# Altium footprint library AD_Lib.PcbLib: 508 footprints (part 10 of 32)
Each footprint in its own frame and in the unit in brackets; x right, y up, seen from the top. Pads: shape width x height; smd on the part's side, far side on the other; paste and mask are expansions set on the pad; w line width, h text height; cw(c..) or ccw(c..) is an arc to the next point about the centre after c.
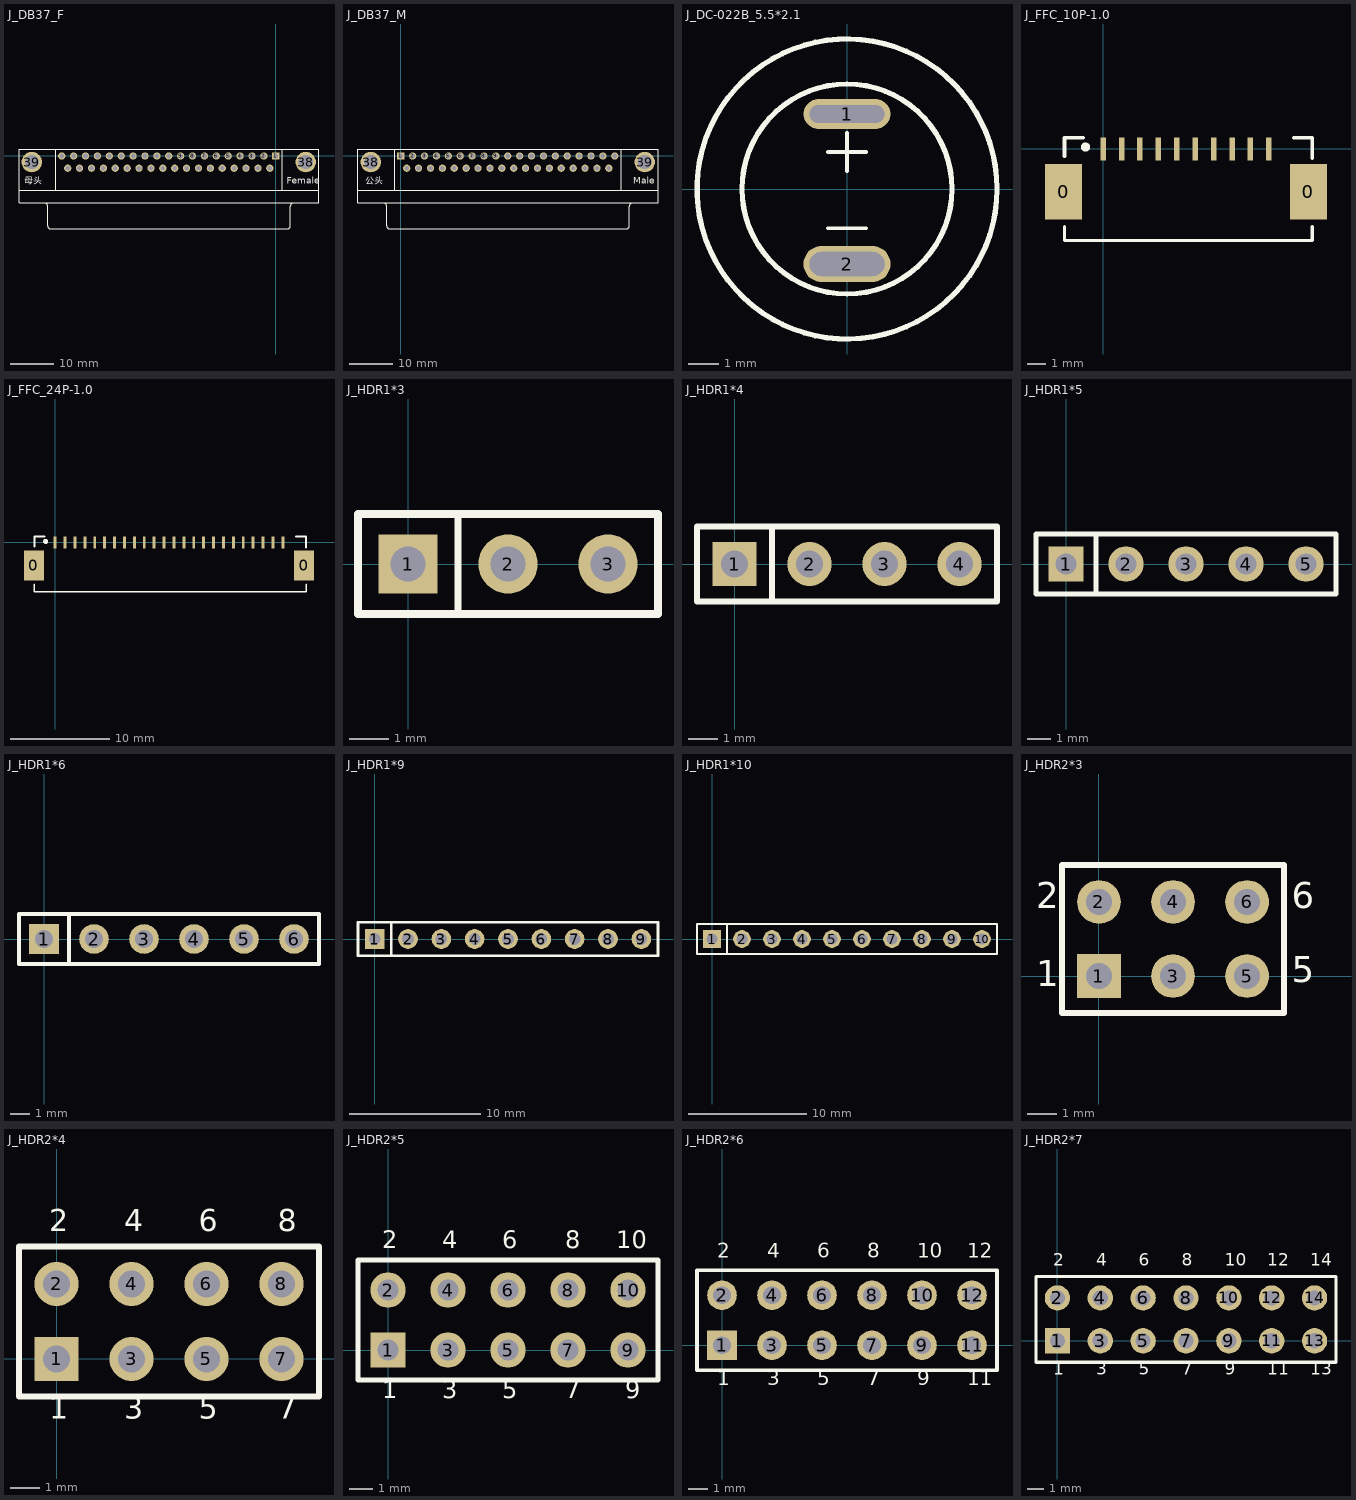
[diagram p9: the footprints below, top view; thin cyan lines are the x and y axes]

## J_DB37_F [mm] "DB37，母头，弯针"
pads (39):
  rect 1.69x1.69 hole 1.09: 1(0,0)
  round 1.69 hole 1.09: 2(-2.761,0) 3(-5.522,0) 4(-8.283,0) 5(-11.044,0) 6(-13.805,0) 7(-16.566,0) 8(-19.327,0) 9(-22.088,0) 10(-24.849,0) 11(-27.61,0) 12(-30.371,0) 13(-33.132,0) 14(-35.893,0) 15(-38.654,0) 16(-41.415,0) 17(-44.176,0) 18(-46.937,0) 19(-49.698,0) 20(-1.38,-2.84) 21(-4.141,-2.84) 22(-6.902,-2.84) 23(-9.663,-2.84) 24(-12.424,-2.84) 25(-15.185,-2.84) 26(-17.946,-2.84) 27(-20.707,-2.84) 28(-23.468,-2.84) 29(-26.229,-2.84) 30(-28.99,-2.84) 31(-31.751,-2.84) 32(-34.512,-2.84) 33(-37.273,-2.84) 34(-40.034,-2.84) 35(-42.795,-2.84) 36(-45.556,-2.84) 37(-48.317,-2.84)
  round 4.76 hole 3.26: 38(6.96,-1.42) 39(-56.658,-1.42)
Top Overlay:
  lines w0.2: -59.628,-7.92 10.038,-7.92 ; -53.673,-10.925 cw(c-53.673,-11.62) -52.978,-11.62 -52.978,-16.22 ; -52.973,-16.225 ccw(c-52.278,-16.225) -52.278,-16.92 2.688,-16.92 ccw(c2.688,-16.225) 3.383,-16.225 ; -51.078,-7.92 -51.078,1.58 ; 1.488,-7.92 1.488,1.58 ; 3.388,-16.22 3.388,-11.62 cw(c4.083,-11.62) 4.083,-10.925 ; -59.628,-10.92 -59.628,1.58 10.038,1.58 10.038,-10.92 -59.628,-10.92
  text "Female" at 2.54,-6.985 h2.54
  text "母头" at -58.42,-6.985 h2.54
Bottom Overlay:
  text "37" at -47.285,-5.715 h2.54
  text "32" at -33.48,-5.715 h2.54
  text "27" at -19.675,-5.715 h2.54
  text "22" at -5.87,-5.715 h2.54
  text "19" at -48.895,1.778 h2.54
  text "15" at -38.273,1.778 h2.54
  text "10" at -23.917,1.778 h2.54
  text "5" at -10.112,1.778 h2.54

## J_DB37_M [mm] "DB37，公头，弯针"
pads (39):
  rect 1.69x1.69 hole 1.09: 1(0,0)
  round 1.69 hole 1.09: 2(2.761,0) 3(5.522,0) 4(8.283,0) 5(11.044,0) 6(13.805,0) 7(16.566,0) 8(19.327,0) 9(22.088,0) 10(24.849,0) 11(27.61,0) 12(30.371,0) 13(33.132,0) 14(35.893,0) 15(38.654,0) 16(41.415,0) 17(44.176,0) 18(46.937,0) 19(49.698,0) 20(1.381,-2.84) 21(4.142,-2.84) 22(6.903,-2.84) 23(9.664,-2.84) 24(12.425,-2.84) 25(15.186,-2.84) 26(17.946,-2.84) 27(20.707,-2.84) 28(23.469,-2.84) 29(26.23,-2.84) 30(28.991,-2.84) 31(31.752,-2.84) 32(34.513,-2.84) 33(37.274,-2.84) 34(40.035,-2.84) 35(42.796,-2.84) 36(45.557,-2.84) 37(48.318,-2.84)
  round 4.76 hole 3.26: 38(-6.96,-1.42) 39(56.658,-1.42)
Top Overlay:
  lines w0.2: -9.93,-7.92 59.736,-7.92 ; -3.975,-10.925 cw(c-3.975,-11.62) -3.28,-11.62 -3.28,-16.22 ; -3.275,-16.225 ccw(c-2.58,-16.225) -2.58,-16.92 52.386,-16.92 ccw(c52.386,-16.225) 53.081,-16.225 ; -1.38,-7.92 -1.38,1.58 ; 51.186,-7.92 51.186,1.58 ; 53.086,-16.22 53.086,-11.62 cw(c53.781,-11.62) 53.781,-10.925 ; -9.93,-10.92 59.736,-10.92 59.736,1.58 -9.93,1.58 -9.93,-10.92
  text "公头" at -8.255,-6.985 h2.54
  text "Male" at 53.975,-6.985 h2.54
Bottom Overlay:
  text "15" at 39.586,1.778 h2.54
  text "10" at 25.781,1.778 h2.54
  text "5" at 11.425,1.778 h2.54
  text "1" at 0.381,1.778 h2.54
  text "35" at 43.828,-5.715 h2.54
  text "30" at 30.023,-5.715 h2.54
  text "25" at 16.218,-5.715 h2.54
  text "20" at 2.413,-5.715 h2.54

## J_DC-022B_5.5*2.1 [mm] "低压直流电源插座"
height 12.1
pads (2):
  oval 2.9x1 hole 0.6 slot 2.5 at 0 deg: 1(0,2.5)
  oval 2.9x1.2 hole 0.8 slot 2.5 at 0 deg: 2(0,-2.5)
Top Overlay:
  circle w0.178: c0,0 r3.5
  circle w0.178: c0,0 r5
  lines w0.127: -0.635,-1.31 0.635,-1.31 ; -0.635,1.23 0.635,1.23 ; 0,0.595 0,1.865

## J_FFC_10P-1.0 [mm] "FFC/FPC扁平电缆插座，10Pin，间距1.0mm"
height 5
pads (12):
  rect 2x3 smd: 0(-2.15,-2.325) 0(11.15,-2.325)
  rect 0.3x1.25 smd: 1(0,0) 2(1,0) 3(2,0) 4(3,0) 5(4,0) 6(5,0) 7(6,0) 8(7,0) 9(8,0) 10(9,0)
Top Overlay:
  circle w0.25: c-0.959,0.108 r0.125
  lines w0.178: -2.104,-4.21 -2.104,-4.972 11.358,-4.972 11.358,-4.21
  lines w0.2: -2.104,-0.4 -2.104,0.609 ; -2.098,0.616 -1.088,0.616 ; 10.348,0.616 11.358,0.616 11.358,-0.485

## J_FFC_24P-1.0 [mm] "FFC/FPC扁平电缆插座，24Pin，间距1.0mm"
height 5
pads (26):
  rect 2x3 smd: 0(-2.15,-2.325) 0(25.15,-2.325)
  rect 0.3x1.25 smd: 1(0,0) 2(1,0) 3(2,0) 4(3,0) 5(4,0) 6(5,0) 7(6,0) 8(7,0) 9(8,0) 10(9,0) 11(10,0) 12(11,0) 13(12,0) 14(13,0) 15(14,0) 16(15,0) 17(16,0) 18(17,0) 19(18,0) 20(19,0) 21(20,0) 22(21,0) 23(22,0) 24(23,0)
Top Overlay:
  circle w0.25: c-0.959,0.108 r0.125
  lines w0.178: -2.104,-4.21 -2.104,-4.972 25.358,-4.972 25.358,-4.21
  lines w0.2: -2.104,-0.4 -2.104,0.609 ; -2.098,0.616 -1.088,0.616 ; 24.348,0.616 25.358,0.616 25.358,-0.485

## J_HDR1*3 [mm] "单排针"
height 5
pads (3):
  rect 1.5x1.5 hole 0.9: 1(0,0)
  round 1.5 hole 0.9: 2(2.54,0) 3(5.08,0)
Top Overlay:
  lines w0.178: 1.27,-1.27 1.27,1.27
  lines w0.2: -1.27,-1.27 6.35,-1.27 6.35,1.27 -1.27,1.27 -1.27,-1.27
Bottom Overlay:
  lines w0.178: -1.27,-1.27 -1.27,1.27 1.27,1.27 1.27,-1.27 -1.27,-1.27

## J_HDR1*4 [mm] "Connector; Header; 1*4"
height 1.45
pads (4):
  rect 1.5x1.5 hole 0.9: 1(0,0)
  round 1.5 hole 0.9: 2(2.54,0) 3(5.08,0) 4(7.62,0)
Top Overlay:
  lines w0.2: 1.27,-1.27 1.27,1.27 ; -1.27,-1.27 -1.27,1.27 8.89,1.27 8.89,-1.27 -1.27,-1.27
Bottom Overlay:
  lines w0.2: -1.27,-1.27 -1.27,1.27 1.27,1.27 1.27,-1.27 -1.27,-1.27

## J_HDR1*5 [mm] "Connector; Header; 1*5"
height 1.45
pads (5):
  rect 1.5x1.5 hole 0.9: 1(0,0)
  round 1.5 hole 0.9: 2(2.54,0) 3(5.08,0) 4(7.62,0) 5(10.16,0)
Top Overlay:
  lines w0.2: 1.27,-1.27 1.27,1.27 ; -1.27,-1.27 11.43,-1.27 11.43,1.27 -1.27,1.27 -1.27,-1.27
Bottom Overlay:
  lines w0.2: -1.27,-1.27 1.27,-1.27 1.27,1.27 -1.27,1.27 -1.27,-1.27

## J_HDR1*6 [mm] "Connector; Header; 1*6"
height 1.45
pads (6):
  rect 1.5x1.5 hole 0.9: 1(0,0)
  round 1.5 hole 0.9: 2(2.54,0) 3(5.08,0) 4(7.62,0) 5(10.16,0) 6(12.7,0)
Top Overlay:
  lines w0.2: 1.27,-1.27 1.27,1.27 ; -1.27,-1.27 13.97,-1.27 13.97,1.27 -1.27,1.27 -1.27,-1.27
Bottom Overlay:
  lines w0.2: -1.27,-1.27 1.27,-1.27 1.27,1.27 -1.27,1.27 -1.27,-1.27

## J_HDR1*9 [mm] "Connector; Header; 1*9"
height 1.45
pads (9):
  rect 1.5x1.5 hole 0.9: 1(0,0)
  round 1.5 hole 0.9: 2(2.54,0) 3(5.08,0) 4(7.62,0) 5(10.16,0) 6(12.7,0) 7(15.24,0) 8(17.78,0) 9(20.32,0)
Top Overlay:
  lines w0.2: 1.27,-1.27 1.27,1.27 ; -1.27,-1.27 21.59,-1.27 21.59,1.27 -1.27,1.27 -1.27,-1.27
Bottom Overlay:
  lines w0.2: -1.27,-1.27 1.27,-1.27 1.27,1.27 -1.27,1.27 -1.27,-1.27

## J_HDR1*10 [mm] "Connector; Header; 1*10"
height 1.45
pads (10):
  rect 1.5x1.5 hole 0.9: 1(0,0)
  round 1.5 hole 0.9: 2(2.54,0) 3(5.08,0) 4(7.62,0) 5(10.16,0) 6(12.7,0) 7(15.24,0) 8(17.78,0) 9(20.32,0) 10(22.86,0)
Top Overlay:
  lines w0.2: 1.27,-1.27 1.27,1.27 ; -1.27,-1.27 24.13,-1.27 24.13,1.27 -1.27,1.27 -1.27,-1.27
Bottom Overlay:
  lines w0.2: -1.27,-1.27 1.27,-1.27 1.27,1.27 -1.27,1.27 -1.27,-1.27

## J_HDR2*3 [mm] "Connector; Header; 2*3"
height 2.2
pads (6):
  rect 1.5x1.5 hole 0.9: 1(0,0)
  round 1.5 hole 0.9: 2(0,2.54) 3(2.54,0) 4(2.54,2.54) 5(5.08,0) 6(5.08,2.54)
Top Overlay:
  lines w0.2: 1.482,-1.27 6.35,-1.27 ; 6.35,-1.27 -1.27,-1.27 -1.27,3.81 6.35,3.81 6.35,-1.27
  text "1" at -2.159,-0.635 h1.52
  text "2" at -2.159,2.032 h1.52
  text "5" at 6.604,-0.508 h1.52
  text "6" at 6.604,2.032 h1.52

## J_HDR2*4 [mm] "Connector; Header; 2*4"
height 1.45
pads (8):
  rect 1.5x1.5 hole 0.9: 1(0,0)
  round 1.5 hole 0.9: 2(0,2.54) 3(2.54,0) 4(2.54,2.54) 5(5.08,0) 6(5.08,2.54) 7(7.62,0) 8(7.62,2.54)
Top Overlay:
  lines w0.2: -1.27,-1.27 8.89,-1.27 8.89,3.81 -1.27,3.81 -1.27,-1.27
  text "6" at 4.826,4.064 h1.27
  text "4" at 2.286,4.064 h1.27
  text "5" at 4.826,-2.286 h1.27
  text "3" at 2.286,-2.286 h1.27
  text "2" at -0.254,4.064 h1.27
  text "1" at -0.254,-2.286 h1.27
  text "7" at 7.493,-2.286 h1.27
  text "8" at 7.493,4.064 h1.27
Bottom Overlay:
  text "8" at 7.874,4.064 h1.27
  text "6" at 5.207,4.064 h1.27
  text "4" at 2.794,4.064 h1.27
  text "2" at 0.254,4.064 h1.27
  text "3" at 2.667,-2.286 h1.27
  text "1" at 0.127,-2.286 h1.27
  text "5" at 5.207,-2.286 h1.27
  text "7" at 7.874,-2.286 h1.27

## J_HDR2*5 [mm] "Connector; Header; 2*5"
height 1.45
pads (10):
  rect 1.5x1.5 hole 0.9: 1(0,0)
  round 1.5 hole 0.9: 2(0,2.54) 3(2.54,0) 4(2.54,2.54) 5(5.08,0) 6(5.08,2.54) 7(7.62,0) 8(7.62,2.54) 9(10.16,0) 10(10.16,2.54)
Top Overlay:
  lines w0.2: -1.27,-1.27 11.43,-1.27 11.43,3.81 -1.27,3.81 -1.27,-1.27
  text "6" at 4.826,4.064 h1.27
  text "4" at 2.286,4.064 h1.27
  text "5" at 4.826,-2.286 h1.27
  text "3" at 2.286,-2.286 h1.27
  text "2" at -0.254,4.064 h1.27
  text "1" at -0.254,-2.286 h1.27
  text "7" at 7.493,-2.286 h1.27
  text "8" at 7.493,4.064 h1.27
  text "10" at 9.652,4.064 h1.27
  text "9" at 10.033,-2.286 h1.27
Bottom Overlay:
  text "8" at 7.874,4.064 h1.27
  text "6" at 5.207,4.064 h1.27
  text "4" at 2.794,4.064 h1.27
  text "2" at 0.254,4.064 h1.27
  text "3" at 2.667,-2.286 h1.27
  text "1" at 0.127,-2.286 h1.27
  text "5" at 5.207,-2.286 h1.27
  text "7" at 7.874,-2.286 h1.27
  text "9" at 10.414,-2.286 h1.27
  text "10" at 10.668,4.064 h1.27

## J_HDR2*6 [mm] "Connector; Header; 2*6"
height 1.45
pads (12):
  rect 1.5x1.5 hole 0.9: 1(0,0)
  round 1.5 hole 0.9: 2(0,2.54) 3(2.54,0) 4(2.54,2.54) 5(5.08,0) 6(5.08,2.54) 7(7.62,0) 8(7.62,2.54) 9(10.16,0) 10(10.16,2.54) 11(12.7,0) 12(12.7,2.54)
Top Overlay:
  lines w0.2: -1.27,-1.27 -1.27,3.81 13.97,3.81 13.97,-1.27 -1.27,-1.27
  text "11" at 12.446,-2.286 h1.27
  text "12" at 12.446,4.191 h1.27
  text "10" at 9.906,4.191 h1.27
  text "8" at 7.366,4.191 h1.27
  text "6" at 4.826,4.191 h1.27
  text "4" at 2.286,4.191 h1.27
  text "2" at -0.254,4.191 h1.27
  text "9" at 9.906,-2.286 h1.27
  text "7" at 7.366,-2.286 h1.27
  text "5" at 4.826,-2.286 h1.27
  text "3" at 2.286,-2.286 h1.27
  text "1" at -0.254,-2.286 h1.27
Bottom Overlay:
  text "12" at 13.589,4.191 h1.27
  text "11" at 13.589,-2.286 h1.27
  text "1" at 0.254,-2.286 h1.27
  text "3" at 2.794,-2.286 h1.27
  text "5" at 5.334,-2.286 h1.27
  text "7" at 7.874,-2.286 h1.27
  text "9" at 10.414,-2.286 h1.27
  text "2" at 0.254,4.191 h1.27
  text "4" at 2.794,4.191 h1.27
  text "6" at 5.334,4.191 h1.27
  text "8" at 7.874,4.191 h1.27
  text "10" at 11.049,4.191 h1.27

## J_HDR2*7 [mm] "Connector; Header; 2*7"
height 1.45
pads (14):
  rect 1.5x1.5 hole 0.9: 1(0,0)
  round 1.5 hole 0.9: 2(0,2.54) 3(2.54,0) 4(2.54,2.54) 5(5.08,0) 6(5.08,2.54) 7(7.62,0) 8(7.62,2.54) 9(10.16,0) 10(10.16,2.54) 11(12.7,0) 12(12.7,2.54) 13(15.24,0) 14(15.24,2.54)
Top Overlay:
  lines w0.2: -1.27,-1.27 -1.27,3.81 16.51,3.81 16.51,-1.27 -1.27,-1.27
  text "10" at 9.906,4.191 h1.27
  text "8" at 7.366,4.191 h1.27
  text "6" at 4.826,4.191 h1.27
  text "4" at 2.286,4.191 h1.27
  text "2" at -0.254,4.191 h1.27
  text "9" at 9.906,-2.286 h1.27
  text "7" at 7.366,-2.286 h1.27
  text "5" at 4.826,-2.286 h1.27
  text "3" at 2.286,-2.286 h1.27
  text "1" at -0.254,-2.286 h1.27
  text "12" at 12.446,4.191 h1.27
  text "11" at 12.446,-2.286 h1.27
  text "13" at 14.986,-2.286 h1.27
  text "14" at 14.986,4.191 h1.27
Bottom Overlay:
  text "1" at 0.254,-2.286 h1.27
  text "3" at 2.794,-2.286 h1.27
  text "5" at 5.334,-2.286 h1.27
  text "7" at 7.874,-2.286 h1.27
  text "9" at 10.414,-2.286 h1.27
  text "2" at 0.254,4.191 h1.27
  text "4" at 2.794,4.191 h1.27
  text "6" at 5.334,4.191 h1.27
  text "8" at 7.874,4.191 h1.27
  text "10" at 11.049,4.191 h1.27
  text "11" at 13.589,-2.286 h1.27
  text "12" at 13.589,4.191 h1.27
  text "14" at 16.129,4.191 h1.27
  text "13" at 16.129,-2.286 h1.27